# Altium footprint library SG__PCB_HOLE_Connector.PcbLib: 174 footprints (part 4 of 11)
Each footprint in its own frame and in the unit in brackets; x right, y up, seen from the top. Pads: shape width x height; smd on the part's side, far side on the other; paste and mask are expansions set on the pad; w line width, h text height; cw(c..) or ccw(c..) is an arc to the next point about the centre after c.
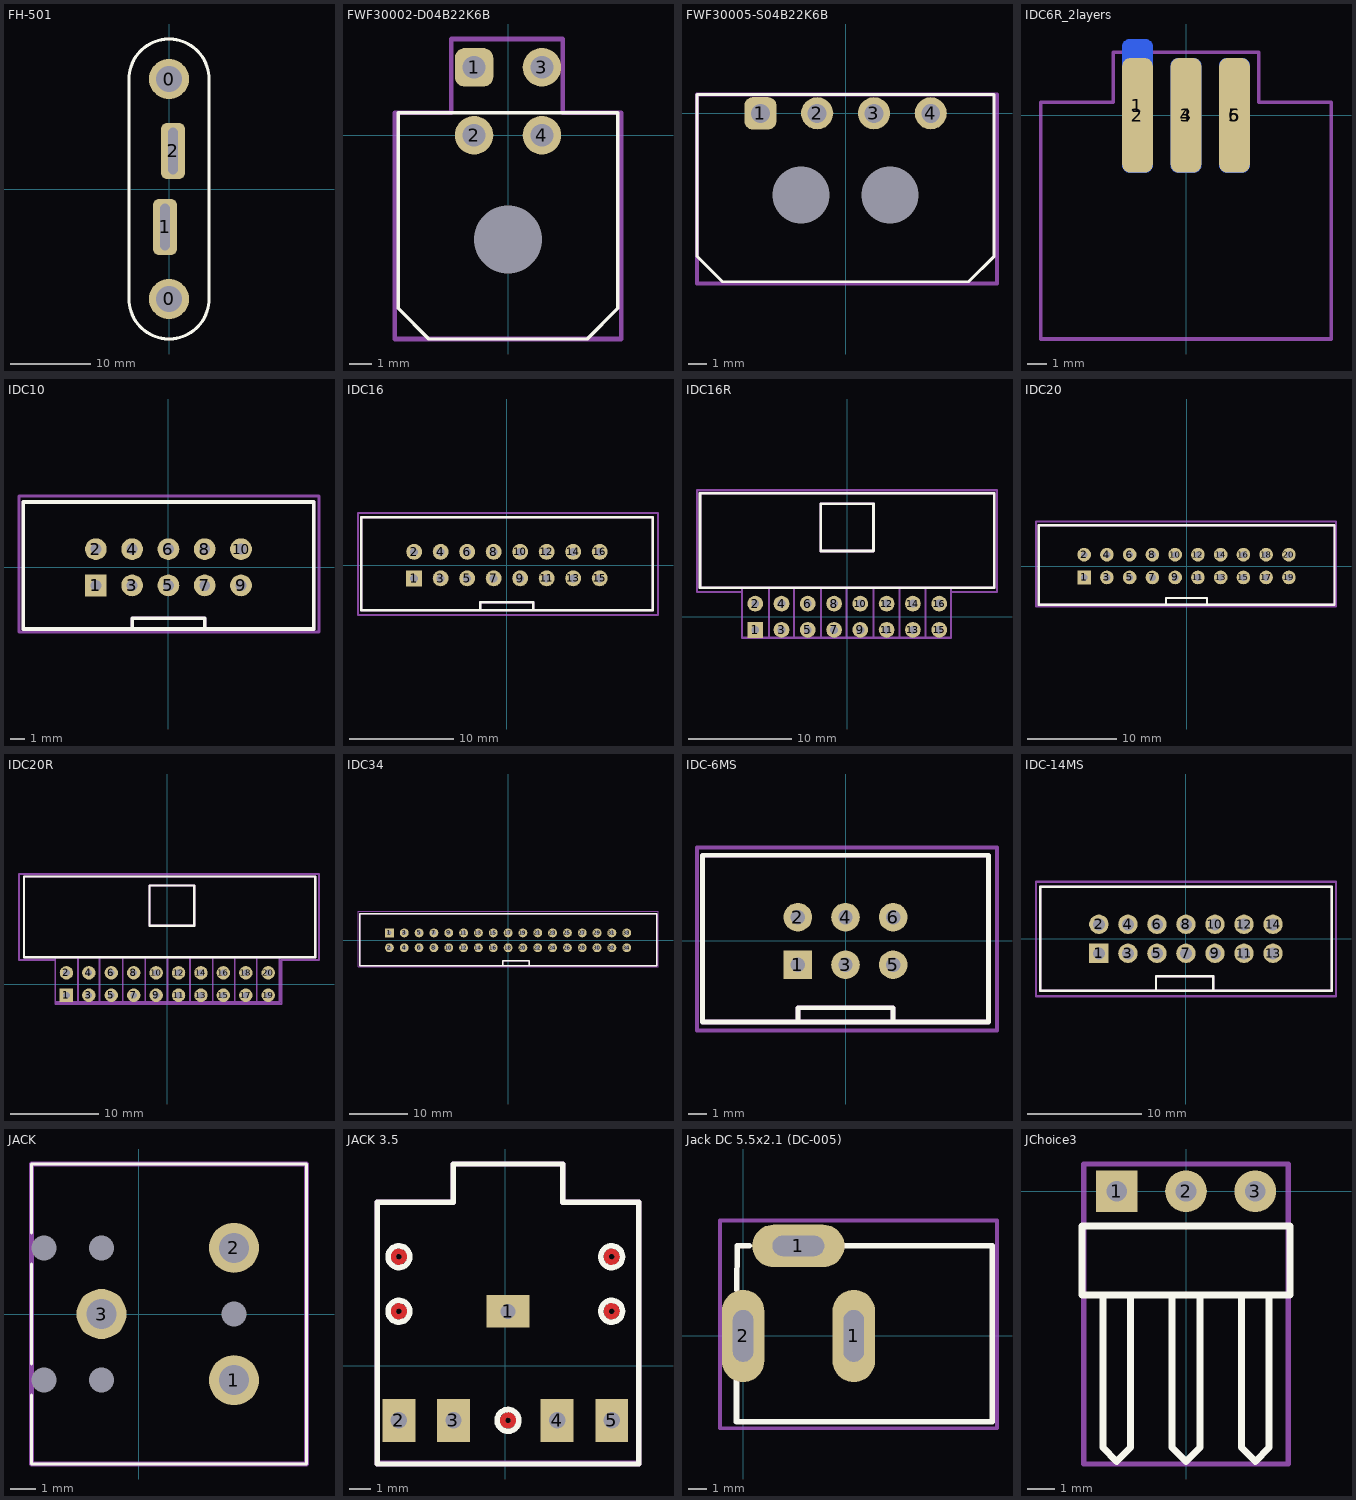
[diagram p3: the footprints below, top view; thin cyan lines are the x and y axes]

## FH-501 [mm]
pads (4):
  round 5 hole 3.2: 0(0,-13.75) 0(0,13.75)
  rrect50% 3x7 hole 1.2 slot 5.8 at 90 deg: 1(-0.5,-4.75) 2(0.5,4.75)
Top Overlay:
  lines w0.4: -5,-13.75 ccw(c0,-13.75) 5,-13.75 5,13.75 ccw(c0,13.75) -5,13.75 -5,-13.75

## FWF30002-D04B22K6B [mm]
pads (5):
  rrect50% 1.7x1.7 hole 1: 1(-1.5,3)
  round 1.7 hole 1: 2(-1.5,0) 3(1.5,3) 4(1.5,0)
  round 1.5 hole 3 unplated: ""(0,-4.6)
Top Overlay:
  lines w0.152: -4.85,-7.65 -3.5,-9 3.5,-9 4.85,-7.65 4.85,1 0,1 -4.85,1 -4.85,-7.65
Top Courtyard:
  lines w0.2: -5,-9 -5,1 -2.5,1 -2.5,4.25 2.425,4.25 2.425,1 5,1 5,-9 -5,-9
3D body: height 7.37, standoff 0, extent -4.85,-9 4.85,1
3D body: height 3.3, standoff -3.2, extent 0.744,-5.85 1.958,-3.35
3D body: height 3.3, standoff -3.2, extent -1.928,-5.85 -0.714,-3.35

## FWF30005-S04B22K6B [mm]
pads (6):
  rrect50% 1.7x1.7 hole 1: 1(-4.5,0)
  round 1.7 hole 1: 2(-1.5,0) 3(1.5,0) 4(4.5,0)
  round 1.5 hole 3 unplated: ""(-2.35,-4.32) ""(2.35,-4.32)
Top Overlay:
  lines w0.152: -7.85,-7.55 -6.5,-8.9 6.5,-8.9 7.85,-7.55 7.85,1 0,1 -7.85,1 -7.85,-7.55
Top Courtyard:
  lines w0.2: -7.85,-9 8,-9 8,1 -7.85,1 -7.85,-9
3D body: height 4.37, standoff 0, extent -7.85,-8.9 7.85,1
3D body: height 3.3, standoff -3.2, extent -4.314,-5.56 -3.1,-3.06
3D body: height 3.3, standoff -3.2, extent 3.1,-5.56 4.314,-3.06

## IDC6R_2layers [mm]
pads (6):
  rrect50% 1.6x7 smd far side: 1(-2.54,0.5)
  rrect50% 1.6x6 smd: 2(-2.54,0) 4(0,0) 6(2.54,0)
  rrect50% 1.6x6 smd far side: 3(0,0) 5(2.54,0)
Top Assembly:
  lines w0.2: -7.61,-11.71 7.61,-11.71 7.61,0.69 3.81,0.69 3.81,3.302 -3.81,3.302 -3.81,0.69 -7.61,0.69 -7.61,-11.71
Top Courtyard:
  lines w0.2: -7.61,-11.71 7.61,-11.71 7.61,0.69 3.81,0.69 3.81,3.302 -3.81,3.302 -3.81,0.69 -7.61,0.69 -7.61,-11.71
Bottom Courtyard:
  lines w0.2: -7.61,-11.71 -7.61,0.69 -3.81,0.69 -3.81,3.302 3.81,3.302 3.81,0.69 7.61,0.69 7.61,-11.71 -7.61,-11.71
3D body "IDC-6MS.step": height 4.37, standoff -4.48, extent -7.61,-11.71 7.61,0.69

## IDC10 [mil]
pads (10):
  rect 60x60 hole 30: 1(-200,-50)
  round 60 hole 30: 2(-200,50) 3(-100,-50) 4(-100,50) 5(0,-50) 6(0,50) 7(100,-50) 8(100,50) 9(200,-50) 10(200,50)
Top Overlay:
  lines w10: -100,-170 -100,-140 100,-140 100,-170 ; -400,-170 400,-170 400,180 -400,180 -400,-170
Top Assembly:
  lines w10: -100,-170 -100,-140 100,-140 100,-170 ; -400,-170 400,-170 400,180 -400,180 -400,-170
Top Courtyard:
  lines w7.87: -411.81,-177.95 -411.81,196.06 414.96,196.06 414.96,-177.95 -411.81,-177.95
3D body "IDC-10M.STEP": height 366.14, standoff -122.05, extent -399.61,-173.23 399.61,185.04

## IDC16 [mil]
pads (16):
  rect 60x60 hole 30: 1(-350,-50)
  round 60 hole 30: 2(-350,50) 3(-250,-50) 4(-250,50) 5(-150,-50) 6(-150,50) 7(-50,-50) 8(-50,50) 9(50,-50) 10(50,50) 11(150,-50) 12(150,50) 13(250,-50) 14(250,50) 15(350,-50) 16(350,50)
Top Overlay:
  lines w10: -100,-170 -100,-140 -50,-140 100,-140 100,-170 ; -550,-170 550,-170 550,180 -550,180 -550,-170
Top Assembly:
  lines w10: -100,-170 -100,-140 -50,-140 100,-140 100,-170 ; -550,-170 550,-170 550,180 -550,180 -550,-170
Top Courtyard:
  lines w7.87: -561.81,-187.8 -561.81,196.06 570.08,196.06 570.08,-187.8 -561.81,-187.8
3D body "IDC16.step": height 359.45, standoff -128.74, extent -549.61,-168.43 549.6,180

## IDC16R [mil]
pads (16):
  rect 60x60 hole 30: 1(-350,-50)
  round 60 hole 30: 2(-350,50) 3(-250,-50) 4(-250,50) 5(-150,-50) 6(-150,50) 7(-50,-50) 8(-50,50) 9(50,-50) 10(50,50) 11(150,-50) 12(150,50) 13(250,-50) 14(250,50) 15(350,-50) 16(350,50)
Top Overlay:
  lines w10: -560,110 560,110 560,470 -560,470 -560,110 ; -100,250 100,250 100,430 -100,430 -100,250
Top Assembly:
  lines w7.87: -399.43,110 -400,110 -400,-80 394.7,-80 394.7,110 ; -299.82,110 -297.97,110 -297.97,-80 ; -202.97,-80 -202.97,110 -199.28,110 ; -100,-80 -100,110 ; -2.65,-80 -2.65,110 0,110 ; 100,-80 100,110 ; 199.16,-80 199.16,110 ; 297.85,-80 297.85,110 300.62,110
  lines w10: -560,110 560,110 560,470 -560,470 -560,110 ; -100,250 100,250 100,430 -100,430 -100,250
Top Courtyard:
  lines w7.87: -571.65,94.9 -400,94.9 -400,-80 394.7,-80 394.7,94.9 570.08,94.9 570.08,481.5 -571.65,481.5 -571.65,94.9
3D body "IDC16R.step": height 353.54, standoff -93.31, extent -560,-66.93 564.41,466.93

## IDC20 [mil]
pads (20):
  rect 60x60 hole 30: 1(-450,-50)
  round 60 hole 30: 2(-450,50) 3(-350,-50) 4(-350,50) 5(-250,-50) 6(-250,50) 7(-150,-50) 8(-150,50) 9(-50,-50) 10(-50,50) 11(50,-50) 12(50,50) 13(150,-50) 14(150,50) 15(250,-50) 16(250,50) 17(350,-50) 18(350,50) 19(450,-50) 20(450,50)
Top Overlay:
  lines w10: -90,-170 -90,-140 90,-140 90,-170 ; -650,-170 -650,180 650,180 650,-170 -650,-170
Top Assembly:
  lines w10: -90,-170 -90,-140 90,-140 90,-170 ; -650,-170 -650,180 650,180 650,-170 -650,-170
Top Courtyard:
  lines w7.87: -661.81,-177.95 -661.81,196.06 657.09,196.06 657.09,-177.95 -661.81,-177.95
3D body "IDC20.step": height 379.13, standoff -109.06, extent -649.61,-177.32 649.61,171.1

## IDC20R [mil]
pads (20):
  rect 60x60 hole 30: 1(-450,-50)
  round 60 hole 30: 2(-450,50) 3(-350,-50) 4(-350,50) 5(-250,-50) 6(-250,50) 7(-150,-50) 8(-150,50) 9(-50,-50) 10(-50,50) 11(50,-50) 12(50,50) 13(150,-50) 14(150,50) 15(250,-50) 16(250,50) 17(350,-50) 18(350,50) 19(450,-50) 20(450,50)
Top Overlay:
  lines w10: -640,120 -640,480 660,480 660,120 -640,120 ; -80,260 -80,440 120,440 120,260 -80,260
Top Assembly:
  lines w7.87: -502.46,120 -500,120 -500,-80 501,-80 501,120 ; -398.87,-80 -398.87,120 ; -302.61,-80 -302.61,120 ; -199.73,-80 -198.79,-80 -198.79,120 ; -100.63,120 -98.75,120 -98.75,-80 ; 0.35,120 0.5,120 0.5,-80 ; 98.51,120 101.34,120 101.34,-80 ; 201.38,120 202.32,120 202.32,-80 ; 300.48,-80 300.48,120 ; 398.63,-80 398.63,120 400.52,120
  lines w10: -640,120 660,120 660,480 -640,480 -640,120 ; -80,260 -80,440 120,440 120,260 -80,260
Top Courtyard:
  lines w7.87: -661.81,107.48 -500,107.48 -500,-89.37 509.45,-89.37 509.45,107.48 676.77,107.48 676.77,491.34 -661.81,491.34 -661.81,107.48
3D body "IDC20r.step": height 353.54, standoff -93.31, extent -654.41,-56.93 670,476.93

## IDC34 [mil]
pads (35):
  rect 60x60 hole 30: 1(-800,50)
  round 60 hole 30: 2(-800,-50) 3(-700,50) 4(-700,-50) 5(-600,50) 6(-600,-50) 7(-500,50) 8(-500,-50) 9(-400,50) 10(-400,-50) 11(-300,50) 12(-300,-50) 13(-200,50) 14(-200,-50) 15(-100,50) 16(-100,-50) 17(0,50) 18(0,-50) 19(100,50) 20(100,-50) 21(200,50) 22(200,-50) 23(300,50) 24(300,-50) 25(400,50) 26(400,-50) 27(500,50) 28(500,-50) 29(600,50) 30(600,-50) 31(700,50) 32(700,-50) 33(800,50) 34(800,-50) !-1(100,50)
Top Overlay:
  lines w10: -36,-169 -36,-139 144,-139 144,-169 ; -1000,-170 -1000,180 1002,180 1002,-170 -1000,-170
Top Assembly:
  lines w10: -36,-169 -36,-139 144,-139 144,-169 ; -1000,-170 -1000,180 1003,180 1003,-170 -1000,-170
Top Courtyard:
  lines w7.87: -1011.81,-177.95 -1011.81,196.06 1011,196.06 1011,-177.95 -1011.81,-177.95
3D body "User Library-DS1013-34S (IDC-34MS CONNFLY).step": height 354.33, standoff -141.73, extent -1006.09,-177.2 1001,173.2

## IDC-6MS [mil]
pads (6):
  rect 60x60 hole 30: 1(-100,-50)
  round 60 hole 30: 2(-100,50) 3(0,-50) 4(0,50) 5(100,-50) 6(100,50)
Top Overlay:
  lines w10: -100,-170 -100,-140 100,-140 100,-170 ; -300,-170 -300,180 300,180 300,-170 -300,-170
Top Assembly:
  lines w10: -100,-170 -100,-140 100,-140 100,-170 ; -300,-170 -300,180 300,180 300,-170 -300,-170
Top Courtyard:
  lines w7.87: -311.81,-187.8 -311.81,196.06 318.11,196.06 318.11,-187.8 -311.81,-187.8
3D body "IDC-6MS.step": height 379.13, standoff -109.06, extent -300,-170 299.21,178.42

## IDC-14MS [mm]
height 12
pads (14):
  rect 1.7x1.7 hole 1.05 mask+0.05: 1(-7.62,-1.27)
  round 1.7 hole 1.05 mask+0.05: 2(-7.62,1.27) 3(-5.08,-1.27) 4(-5.08,1.27) 5(-2.54,-1.27) 6(-2.54,1.27) 7(0,-1.27) 8(0,1.27) 9(2.54,-1.27) 10(2.54,1.27) 11(5.08,-1.27) 12(5.08,1.27) 13(7.62,-1.27) 14(7.62,1.27)
Top Overlay:
  lines w0.2: -2.62,-4.55 -2.62,-3.27 2.38,-3.27 2.38,-4.55 ; -12.74,-4.55 12.75,-4.55 12.75,4.55 -12.74,4.55 -12.74,-4.55
Top Assembly:
  lines w0.2: -2.62,-4.55 -2.62,-3.27 2.38,-3.27 2.38,-4.55 ; -12.74,-4.55 -12.74,4.55 12.75,4.55 12.75,-4.55 -12.74,-4.55
Top Courtyard:
  lines w0.2: -13.12,-5.02 -13.12,4.98 13.13,4.98 13.13,-5.02 -13.12,-5.02
3D body "IDC-14MS.STEP": height 9.25, standoff -3.45, extent -12.7,-4.675 12.7,4.675

## JACK [mm]
pads (8):
  round 0 hole 1: 0(-3.8,-2.65) 0(-3.8,2.65) 0(-1.5,-2.65) 0(-1.5,2.65) 0(3.8,0)
  round 2 hole 1.2: 1(3.8,-2.65) 2(3.8,2.65) 3(-1.5,0)
Top Overlay:
  lines w0.127: -4.3,-3.25 -4.3,-6 6.7,-6 6.7,6 -4.3,6 -4.3,3.25 ; -4.3,-2 -4.3,2
Top Assembly:
  lines w0.127: -4.3,-6 -4.3,6 6.7,6 6.7,-6 -4.3,-6
Top Courtyard:
  lines w0.2: -4.3,-6 6.7,-6 6.7,6 -4.3,6 -4.3,-6

## JACK 3.5 [mil]
pads (5):
  rect 78.74x60 hole 27.56 square: 1(5,100)
  rect 60x78.74 hole 30: 2(-195,-100) 3(-95,-100) 4(95,-100) 5(195,-100)
Top Layer:
  circle w10: c-195,200 r10
  circle w10: c-195,100 r10
  circle w10: c195,200 r10
  circle w10: c195,100 r10
  circle w10: c5,-100 r10
Top Overlay:
  circle w10: c5,-100 r20
  circle w10: c-195,100 r20
  circle w10: c-195,200 r20
  circle w10: c195,100 r20
  circle w10: c195,200 r20
  lines w10: -235,-180 -235,300 -95,300 -95,370 105,370 105,300 245,300 245,-180 -235,-180
Top Assembly:
  lines w10: -235,-180 245,-180 245,300 105,300 105,370 -95,370 -95,300 -235,300 -235,-180
Top Courtyard:
  lines w7.87: -235,-177.95 245,-177.95 245,300 105,300 105,370 -96.76,370 -96.76,300 -235,300 -235,-177.95
3D body "jack 3-5.stp": height 216.54, standoff -118.11, extent -237.44,-185.59 235,365.59

## Jack DC 5.5x2.1 (DC-005) [mm]
pads (3):
  oval 5x2.3 hole 1.1 slot 2.8 at 0 deg: 1(2.993,4.88)
  oval 2.3x5 hole 1.1 slot 2.8 at 90 deg: 1(5.993,0) 2(0,0)
Top Overlay:
  lines w0.3: -0.359,-2.15 -0.359,-4.636 13.5,-4.636 13.5,4.88 4.491,4.88 ; -0.353,2.5 -0.326,4.88 0.324,4.88
Top Courtyard:
  lines w0.2: -1.25,-5 13.75,-5 13.75,6.25 -1.25,6.25 -1.25,-5
3D body "User Library-dc range - dc connector[4840_2201].STEP": height 12, standoff -2.5, extent -0.326,-4.626 13.5,4.88

## JChoice3 [mil]
pads (3):
  rect 60x60 hole 30: 1(-100,0)
  round 60 hole 30: 2(0,0) 3(100,0)
Top Overlay:
  lines w10: -120,-150 -120,-370 -100,-390 -80,-370 -80,-150 ; -20,-150 -20,-370 0,-390 20,-370 20,-150 ; 80,-150 80,-370 100,-390 120,-370 120,-150 ; -150,-150 -150,-50 150,-50 150,-150 -150,-150
Top Courtyard:
  lines w7.87: -147.64,-393.7 147.64,-393.7 147.64,39.37 -147.64,39.37 -147.64,-393.7
3D body "pls2r.stp": height 168.11, standoff -51.18, extent -150,-388.03 50,19.06
3D body "pls2r.stp": height 168.11, standoff -51.18, extent -50,-388.03 150,19.06